# Altium integrated library CbyP.IntLib: 1144 symbols (part 1 of 6) (continued)
## KH-2.54FH-1X12P-H8.5 (continued)
CONN SOCKET 12POS 2.54mm SINGLE ROW TH; Manufacturer: kinghelm; Mfr.Part #: KH-2.54FH-1X12P-H8.5; LCSC Part #: C2905419; Package: Through Hole,P=2.54mm
footprint Plugin,P=2.54mm,12p,Female Headers
pins: 1, 2, 3, 4, 5, 6, 7, 8, 9, 10, 11, 12

## PH2.0 2P THANG
designator CN?, comment PH2.0-2P
1x2P 2P PH Tin 2 -25℃~+85℃ 2A 1 2mm Brass Direct Insert Plugin,P=2mm Wire To Board Connector ROHS; Manufacturer: JST; Mfr.Part #: B2B-PH-K-S(LF)(SN); Name: PH2.0 2P THANG; So_Chan_Cam: 2; So_Chan_Dan: 0; Package: Plugin,P=2mm
footprint Plugin,P=2mm,2P
pins: 1, 2

## PH2.0 3P THANG
designator CN?, comment PH2.0-3P
1x3P 3P PH Tin 3 -25℃~+85℃ 2A 1 2mm Brass Direct Insert Plugin,P=2mm Wire To Board Connector ROHS; Manufacturer: JST; Mfr.Part #: B3B-PH-K-S(LF)(SN); Name: PH2.0 3P THANG; So_Chan_Cam: 3; So_Chan_Dan: 0; Package: Plugin,P=2mm
footprint Plugin,P=2mm,3P
pins: 1, 2, 3

## PH2.0 4P CONG
designator CN?, comment PH2.0-4P
1x4P 4P PH 1 Tin 2mm 2mm 4 -25℃~+85℃ Brass 1A Bend insert Push-Pull,P=2mm Wire To Board Connector ROHS; Manufacturer: SHOU HAN; Mfr.Part #: 2.0MM-4P WZ; Name: PH2.0 4P THANG; So_Chan_Cam: 4; So_Chan_Dan: 0; Package: Push-Pull,P=2mm
footprint Push-Pull,P=2mm,4P-1
footprint Push-Pull,P=2mm,4P-2
pins: 1, 2, 3, 4

## PH2.0 5P CONG
designator CN?, comment PH2.0-5P
1x5P 5P PH 1 Tin 2mm 2mm 5 -25℃~+85℃ Brass 1A Bend insert Push-Pull,P=2mm Wire To Board Connector ROHS; Manufacturer: SHOU HAN; Mfr.Part #: 2.0MM-5P WZ; Name: PH2.0 2P THANG; So_Chan_Cam: 5; So_Chan_Dan: 0; Package: Push-Pull,P=2mm
footprint Push-Pull,P=2mm,5P-1
footprint Push-Pull,P=2mm,5P-2
pins: 1, 2, 3, 4, 5

## PH2.0 5P THANG
designator CN?, comment PH2.0-5P
1x5P 5P PH Tin 5 -25℃~+85℃ 2A 1 2mm Brass Straight Plugin,P=2mm Wire To Board Connector ROHS; Manufacturer: JST; Mfr.Part #: B5B-PH-K-S(LF)(SN); Name: PH2.0 2P THANG; So_Chan_Cam: 5; So_Chan_Dan: 0; Package: Plugin,P=2mm
footprint Plugin,P=2mm,5P
pins: 1, 2, 3, 4, 5

## PH2.0 8P THANG
designator CN?, comment PH2.0-8P
1x8P 8P PH Tin 8 -25℃~+85℃ 2A 1 2mm Brass Straight Plugin,P=2mm Wire To Board Connector ROHS; Manufacturer: JST; Mfr.Part #: B8B-PH-K-S(LF)(SN); Name: PH2.0 2P THANG; So_Chan_Cam: 8; So_Chan_Dan: 0; Package: Plugin,P=2mm
footprint Plugin,P=2mm,8P
pins: 1, 2, 3, 4, 5, 6, 7, 8

## PH2.0 9P THANG
designator CN?, comment PH2.0-9P
1x9P 9P PH Tin 9 -25℃~+85℃ 2A 1 2mm Brass Direct Insert Plugin,P=2mm Wire To Board Connector ROHS; Manufacturer: JST; Mfr.Part #: B9B-PH-K-S(LF)(SN); Name: PH2.0 9P THANG; So_Chan_Cam: 9; So_Chan_Dan: 0; Package: Plugin,P=2mm
footprint Plugin,P=2mm,9P
pins: 1, 2, 3, 4, 5, 6, 7, 8, 9

## PH2.0 10P CONG
designator CN?, comment PH2.0-10P
1x10P 10P 1 2mm 10 -25℃~+85℃ 1A Bend insert Push-Pull,P=2mm Wire To Board Connector ROHS; Manufacturer: SHOU HAN; Mfr.Part #: 2.0mm-10P WZ; Name: PH2.0 10P CONG; So_Chan_Cam: 10; So_Chan_Dan: 0; Package: Push-Pull,P=2mm
footprint Push-Pull,P=2mm,10P-2
pins: 1, 2, 3, 4, 5, 6, 7, 8, 9, 10

## PH2.0 12P THANG
designator CN?, comment PH2.0-12P
1x12P 12P PH Tin 12 -25℃~+85℃ 2A 1 2mm Brass Direct Insert Plugin,P=2mm Wire To Board Connector ROHS; Manufacturer: JST; Mfr.Part #: B12B-PH-K-S(LF)(SN); Name: PH2.0 12P THANG; So_Chan_Cam: 12; So_Chan_Dan: 0; Package: Plugin,P=2mm
footprint Plugin,P=2mm,12P
pins: 1, 2, 3, 4, 5, 6, 7, 8, 9, 10, 11, 12

## PH2.54 1x6P THANG
designator CN?, comment PH2.54 6P
3A Direct Insert Policy 6P -40℃~+105℃ 2.54mm Single Row Black Brass 1x6P Plugin,P=2.54mm Pin Headers ROHS; Manufacturer: BOOMELE(Boom Precision Elec); Mfr.Part #: 2.54-1x6P; Name: PH2.54 1x6P THANG; So_Chan_Cam: 6; So_Chan_Dan: 0; Package: Plugin,P=2.54mm
footprint Plugin,P=2.54mm,6P,Pin Headers
footprint Plugin,P=2.54mm,6P-1
pins: 1, 2, 3, 4, 5, 6

## PH2.54 1x8P THANG
designator CN?, comment PH2.54 8P
Gold 3A Direct Insert Policy 2.5mm 8P 6mm -40℃~+105℃ 3mm 2.54mm Black Brass Single Row 1x8P Plugin,P=2.54mm Pin Headers ROHS; Manufacturer: hanxia; Mfr.Part #: HX PZ2.54-1x8P ZZ; Name: PH2.54 1x8P THANG; So_Chan_Cam: 8; So_Chan_Dan: 0; Package: Plugin,P=2.54mm
footprint Plugin,P=2.54mm,8P,Pin Headers
footprint Plugin,P=2.54mm,8P-1
pins: 1, 2, 3, 4, 5, 6, 7, 8

## PH2.54 1x20P THANG
designator CN?, comment PH2.54 20P
3A Straight Policy 20P -40℃~+105℃ 2.54mm Single Row Black Brass 1x20P Plugin,P=2.54mm Pin Headers ROHS; Manufacturer: BOOMELE(Boom Precision Elec); Mfr.Part #: 2.54-1*20P; Name: PH2.54 1x20P THANG; So_Chan_Cam: 20; So_Chan_Dan: 0; Package: Plugin,P=2.54mm
footprint Plugin,P=2.54mm,20P,Pin Headers
footprint Plugin,P=2.54mm,20P,Pin Headers-1
pins: 1, 2, 3, 4, 5, 6, 7, 8, 9, 10, 11, 12, 13, 14, 15, 16, 17, 18, 19, 20

## PH2.54 2x2P THANG
designator CN?, comment PH2.54 2x2P
3A Direct Insert Policy 2.5mm 4P 6mm -40℃~+105℃ 3mm 2.54mm Double Row Black Brass 2x2P 2.54mm Plugin,P=2.54mm Pin Headers ROHS; Manufacturer: HCTL; Mfr.Part #: PZ254-2-02-Z-8.5; Name: PH2.54 2x2P THANG; So_Chan_Cam: 4; So_Chan_Dan: 0; Package: Plugin,P=2.54mm
footprint Plugin,P=2.54mm,2X2P,Pin Headers
pins: 1, 2, 3, 4

## PH2.54 2x4P THANG
designator CN?, comment PH2.54 2x4P
3A Direct Insert Policy 2.5mm 8P 6mm -40℃~+105℃ 3mm 2.54mm Double Row Black Brass 2.54mm 2x4P Plugin,P=2.54mm Pin Headers ROHS; Manufacturer: HCTL; Mfr.Part #: PZ254-2-04-Z-8.5; Name: PH2.54 2x4P THANG; So_Chan_Cam: 8; So_Chan_Dan: 0; Package: Plugin,P=2.54mm
footprint Plugin,P=2.54mm,2X4P,Pin Headers
pins: 1, 2, 3, 4, 5, 6, 7, 8

## PH2.54 2x5P THANG
designator CN?, comment PH2.54 2x5P
3A Direct Insert Policy 2.5mm 10P 6mm -40℃~+105℃ 3mm 2.54mm Double Row Black Brass 2x5P 2.54mm Plugin,P=2.54mm Pin; Manufacturer: HCTL; Mfr.Part #: PZ254-2-05-Z-8.5; Name: PH2.54 2x5P THANG; So_Chan_Cam: 10; So_Chan_Dan: 0; Package: Plugin,P=2.54mm
footprint Plugin,P=2.54mm,2X5P,Pin Headers
pins: 1, 2, 3, 4, 5, 6, 7, 8, 9, 10

## PH2.54 2x9P THANG
designator CN?, comment PH2.54 2x9P
3A Direct Insert Policy 2.5mm 260℃@10S 36P 6mm -40℃~+105℃ 3mm 2.54mm Double Row Black Brass 2x18P 2.54mm Plugin,P=2.54mm Pin Headers ROHS; Manufacturer: HCTL; Mfr.Part #: PZ254-2-18-Z-8.5; Name: PH2.54 2x9P THANG; So_Chan_Cam: 18; So_Chan_Dan: 0; Package: Plugin,P=2.54mm
footprint Plugin,P=2.54mm,2X9P,Pin Headers
pins: 1, 2, 3, 4, 5, 6, 7, 8, 9, 10, 11, 12, 13, 14, 15, 16, 17, 18

## PH2.54 2x15P THANG
designator CN?, comment FH2.54 2x15P
2.54mm 2.54mm Double Row 3A Copper alloy 30P -40℃~+105℃ Direct Insert 2x15P 8.5mm Top Square Hole Plugin,P=2.54mm Female Headers ROHS; Manufacturer: HCTL; Mfr.Part #: PM254-2-15-Z-8.5; Name: FH2.54 2x15P THANG; So_Chan_Cam: 30; So_Chan_Dan: 0; Package: Plugin,P=2.54mm
footprint Plugin,P=2.54mm,2x15P,Pin Headers
pins: 1, 2, 3, 4, 5, 6, 7, 8, 9, 10, 11, 12, 13, 14, 15, 16, 17, 18, 19, 20, 21, 22, 23, 24, 25, 26, 27, 28, 29, 30

## PH2.54-1X2P-H25
designator CN?, comment PH2.54-2P
Pin Header 2 Position 2.54mm Pitch Single Row Through Hole -40℃~+105℃; Manufacturer: JXTCONN; Mfr.Part #: PH2.54-1X2P-H25; LCSC Part #: C42431798; Package: Through Hole,P=2.54mm; DigiKey Part Number: NO; ComponentLink1Description: Link; ComponentLink1URL: https://www.lcsc.com/product-detail/C42431798.html?s_z=n_2.54-1%2a2P
footprint Plugin,P=2.54mm,2P,Pin Headers
pins: 1, 2

## PH2.54-1X4P-H25
designator CN?, comment PH2.54-4P
Pin Header 4 Position 2.54mm Pitch Single Row Through Hole -40℃~+105℃; Manufacturer: JXTCONN; Mfr.Part #: PH2.54-1X4P-H25; DigiKey Part Number: NO; Package: Plugin,P=2.54mm; LCSC Part #: C42431808
footprint Plugin,P=2.54mm,4P,Pin Headers
pins: 1, 2, 3, 4

## PH2.54-06PB2G-H25
designator CN?, comment PH2.54-6P
Gold 3A Through Hole Pin Header 2.5mm 6P 6mm -40℃~+105℃ 3mm 2.54mm Brass Black 1 1x6P Through Hole,P=2.54mm Pin Headers ROHS; Manufacturer: JXTCONN; Mfr.Part #: PH2.54-06PB2G-H25; LCSC Part #: C42431807; Package: Through Hole,P=2.54mm
footprint Plugin,P=2.54mm,6P,Pin Headers
pins: 1, 2, 3, 4, 5, 6

## Plugin,P=5.08mm,2P
designator CN?, comment 282837-2
13.5A 300V Green 16~28 Straight 5.08mm 1 3 Plugin,P=5.08mm Screw terminal ROHS; MF: TE Connectivity; SnapEDA_Link: https://www.snapeda.com/parts/282837-2/TE+Connectivity+AMP+Connectors/view-part/?ref=snap; Price: None; Check_prices: https://www.snapeda.com/parts/282837-2/TE+Connectivity+AMP+Connectors/view-part/?ref=eda; Purchase-URL: https://pricing.snapeda.com/search/part/282837-2/?ref=eda; MP: 282837-2; Value: *; Availability: In Stock; Package: None
footprint Plugin,P=5.08mm,2P
pins: 1, 2

## PM2.54-1*10
designator CN?, comment FH2.54-10P
Female Header 10 Position 2.54mm Pitch Single Row Through Hole -40℃~+105℃; Manufacturer: ZHOURI; Mfr.Part #: PM2.54-1*10; LCSC Part #: C5116489; Package: Through Hole,P=2.54mm
footprint Plugin,P=2.54mm,10P,FEMALE HEADERS
pins: 1, 2, 3, 4, 5, 6, 7, 8, 9, 10

## PM254-2-05-Z-8.5
designator CN?, comment FH2.54-2x5P
Female Header 10 Position 2.54mm Pitch Dual Row Through Hole -40℃~+105℃; Manufacturer: HCTL; Mfr.Part #: PM254-2-05-Z-8.5; LCSC Part #: C2897406; Package: Through Hole,P=2.54mm
footprint Through Hole,P=2.54mm,2x5P,Female Headers
pins: 1, 2, 3, 4, 5, 6, 7, 8, 9, 10

## PZ254-2-03-Z-8.5
designator CN?, comment PH2.54-2x3P
6P 2x3P Brass -40℃~+105℃ Black Pin Header 2.54mm 2.5mm 6mm 3mm 2 3A Through Hole 2.54mm Through Hole,P=2.54mm Headers, Male Pins RoHS; Manufacturer: HCTL; Mfr.Part #: PZ254-2-03-Z-8.5; LCSC Part #: PH2.54 2x3P THANG; Package: Through Hole,P=2.54mm; DigiKey Part Number: NO
footprint Plugin,P=2.54mm,2X3P,Pin Headers
pins: 1, 2, 3, 4, 5, 6

## PZ254V-11-07P
designator CN?, comment PH2.54-7P
Pin Header 7 Position 2.54mm Pitch Single Row Through Hole -40℃~+105℃; Manufacturer: XFCN; Mfr.Part #: PZ254V-11-07P; LCSC Part #: C492406; Package: Through Hole,P=2.54mm
footprint Through Hole,P=2.54mm,7P,Pin Headers
pins: 1, 2, 3, 4, 5, 6, 7

## PZ254V-11-08P
designator CN?, comment PH2.54-8P
CONN HEADER 8POS 2.54mm SINGLE ROW TH; Manufacturer: XFCN; Mfr.Part #: PZ254V-11-08P; LCSC Part #: C492407; Package: Through Hole,P=2.54mm
footprint Through Hole,P=2.54mm,8P,Pin Headers
pins: 1, 2, 3, 4, 5, 6, 7, 8

## PZ254V-11-12P
designator CN?, comment PH2.54-12P
CONN HEADER 12POS 2.54mm SINGLE ROW TH; Manufacturer: XFCN; Mfr.Part #: PZ254V-11-12P; LCSC Part #: C2840012; Package: Through Hole,P=2.54mm
footprint Plugin,P=2.54mm,12P,Pin Headers
pins: 1, 2, 3, 4, 5, 6, 7, 8, 9, 10, 11, 12

## PZ254V-12-16P
designator CN?, comment PH2.54-2x8P
Pin Header 16 Position 2.54mm Pitch Dual Row Through Hole -40℃~+105℃; Manufacturer: XFCN; Mfr.Part #: PZ254V-12-16P; LCSC Part #: C492425; Package: Through Hole,P=2.54mm; DigiKey Part Number: NO
footprint Plugin,P=2.54mm,2X8P,Pin Headers
pins: 1, 2, 3, 4, 5, 6, 7, 8, 9, 10, 11, 12, 13, 14, 15, 16

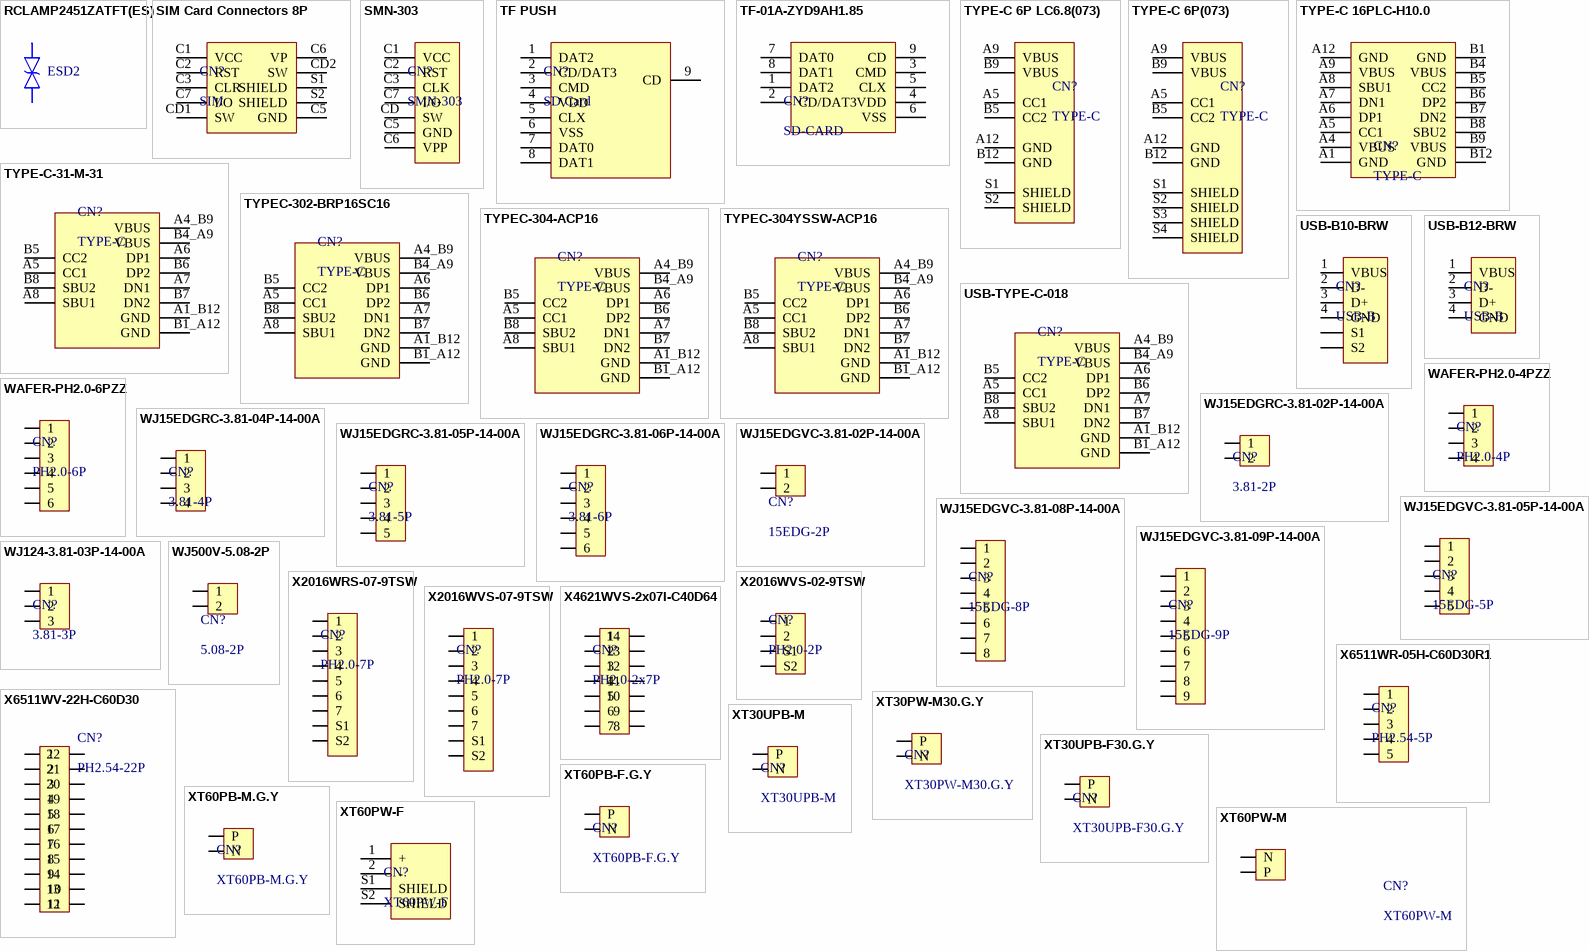
[diagram p3: symbols RCLAMP2451ZATFT(ES) to XT60PW-M]

## RCLAMP2451ZATFT(ES)
designator ESD2  (value not drawn)
ESD DIODE 24VWM 5.6VC DFN0603-2L; Manufacturer: ElecSuper; Mfr.Part #: RCLAMP2451ZATFT(ES); Package: DFN0603-2L; LCSC Part #: C42400636
footprint DFN0603-2L
pins: 1 A, 2 K

## SIM Card Connectors 8P
designator CN?, comment SIM
Self-bouncing 1.8mm Card Slot -40℃~+85℃ MiniSIM card SMD SIM Card Connectors ROHS; Manufacturer: MOLEX; Mfr.Part #: 475531001; Name: SIM Card Connectors 8P; So_Chan_Cam: 0; So_Chan_Dan: 10; Package: SMD
footprint SMD-SIM
pins: C1 VCC, C2 RST, C3 CLR, C5 GND, C6 VP, C7 I/O, CD1 SW, CD2 SW, S1 SHIELD, S2 SHIELD

## SMN-303
designator CN?
Card Connector NANO SIM Push-Push Surface Mount; Manufacturer: XUNPU; Mfr.Part #: SMN-303; LCSC Part #: C266888; Package: SMD; DigiKey Part Number: NO; ComponentLink1Description: Link; ComponentLink1URL: https://www.lcsc.com/product-detail/C266888.html?s_z=n_SMN303; ComponentLink2Description: Link 1
footprint SIM_NANO_CARD_SMD
pins: C1 VCC, C2 RST, C3 CLK, C5 GND, C6 VPP, C7 I/O, CD SW

## TF PUSH
designator CN?, comment SD Card
-25℃~+90℃ Push-Push 2mm Connector and Ejector MicroSD Card (TF Card) SMD PC Card Sockets ROHS; Manufacturer: SHOU HAN; Mfr.Part #: TF PUSH; LCSC Part #: C393941; Package: SMD; DigiKey Part Number: NO
footprint SMD-SD CARD
pins: 1 DAT2, 2 CD/DAT3, 3 CMD, 4 VDD, 5 CLX, 6 VSS, 7 DAT0, 8 DAT1, 9 CD

## TF-01A-ZYD9AH1.85
designator CN?, comment SD-CARD
Micro SD card (TF card) Surface Mount; Manufacturer: XYECONN; Mfr.Part #: TF-01A-ZYD9AH1.85; LCSC Part #: C20613191; Package: SMD; DigiKey Part Number: NO
footprint SMD-SD CARD
pins: 1 DAT2, 2 CD/DAT3, 3 CMD, 4 VDD, 5 CLX, 6 VSS, 7 DAT0, 8 DAT1, 9 CD

## TYPE-C 6P LC6.8(073)
designator CN?, comment TYPE-C
CONN RCPT Type-C 6POS TH; Mfr.Part #: TYPE-C 6P LC6.8(073); Manufacturer: SHOU HAN; Package: Through Hole; LCSC Part #: C2858272
footprint TYPE-C-6P-1
pins: A5 CC1, A9 VBUS (power), A12 GND (power), B5 CC2, B9 VBUS (power), B12 GND (power), S1 SHIELD, S2 SHIELD

## TYPE-C 6P(073)
designator CN?, comment TYPE-C
CONN RCPT USB 3.1 Type-C 6POS SMD R/A; Mfr.Part #: TYPE-C 6P(073); Manufacturer: SHOU HAN; Package: SMD; LCSC Part #: C668623
footprint TYPE-C-6P-SMD
pins: A5 CC1, A9 VBUS (power), A12 GND (power), B5 CC2, B9 VBUS (power), B12 GND (power), S1 SHIELD, S2 SHIELD, S3 SHIELD, S4 SHIELD

## TYPE-C 16PLC-H10.0
designator CN?, comment TYPE-C
USB-C (USB TYPE-C) Receptacle Connector 16 Position Through Hole; Manufacturer: SHOU HAN; Mfr.Part #: TYPE-C 16PLC-H10.0; LCSC Part #: C3151747; Package: Through Hole; DigiKey Part Number: NO; ComponentLink1Description: Link; ComponentLink1URL: https://www.lcsc.com/product-detail/C3151747.html?s_z=n_TYPE-C
footprint TYPE-C-16P-4
pins: A1 GND (power), A4 VBUS (power), A5 CC1, A6 DP1, A7 DN1, A8 SBU1, A9 VBUS (power), A12 GND (power), B1 GND (power), B4 VBUS (power), B5 CC2, B6 DP2, B7 DN2, B8 SBU2, B9 VBUS (power), B12 GND (power)

## TYPE-C-31-M-31
designator CN?, comment TYPE-C
USB-C (USB TYPE-C) Receptacle Connector 16 Position Surface Mount, Right Angle; Manufacturer: Korean Hroparts Elec; Mfr.Part #: TYPE-C-31-M-31; LCSC Part #: C2760486; Package: SMD; DigiKey Part Number: NO
footprint TYPE-C-16P-2
pins: A1_B12 GND (power), A4_B9 VBUS (power), A5 CC1, A6 DP1, A7 DN1, A8 SBU1, B1_A12 GND (power), B4_A9 VBUS (power), B5 CC2, B6 DP2, B7 DN2, B8 SBU2

## TYPEC-302-BRP16SC16
designator CN?, comment TYPE-C
5A USB 3.1 1 260℃ Sink board 16P Female -45℃~+85℃ Type-C SMD USB Connectors ROHS; Manufacturer: XUNPU; Mfr.Part #: TYPEC-302-BRP16SC16; DigiKey Part Number: NO; LCSC Part #: C2835313; Package: SMD
footprint TYPE-C-16P-1
pins: A1_B12 GND (power), A4_B9 VBUS (power), A5 CC1, A6 DP1, A7 DN1, A8 SBU1, B1_A12 GND (power), B4_A9 VBUS (power), B5 CC2, B6 DP2, B7 DN2, B8 SBU2

## TYPEC-304-ACP16
designator CN?, comment TYPE-C
3A 1 Horizontal attachment 16P Female -40℃~+85℃ Type-C SMD USB Connectors ROHS; Manufacturer: XUNPU; Mfr.Part #: TYPEC-304-ACP16; So_Chan_Dan: 20; So_Chan_Cam: 0; Name: TYPEC-304-ACP16; Package: SMD
footprint TYPE-C-16P-2
pins: A1_B12 GND (power), A4_B9 VBUS (power), A5 CC1, A6 DP1, A7 DN1, A8 SBU1, B1_A12 GND (power), B4_A9 VBUS (power), B5 CC2, B6 DP2, B7 DN2, B8 SBU2

## TYPEC-304YSSW-ACP16
designator CN?, comment TYPE-C
1 16P -25℃~+85℃ Type-C SMD USB, DVI, HDMI Connector Assemblies RoHS; Manufacturer: XUNPU; Mfr.Part #: TYPEC-304YSSW-ACP16; LCSC Part #: C2840392; DigiKey Part Number: NO; Package: SMD
footprint TYPE-C-16P-3
pins: A1_B12 GND (power), A4_B9 VBUS (power), A5 CC1, A6 DP1, A7 DN1, A8 SBU1, B1_A12 GND (power), B4_A9 VBUS (power), B5 CC2, B6 DP2, B7 DN2, B8 SBU2

## USB-B10-BRW
designator CN?, comment USB-B
CONN RCPT USB 2.0 Type-B 4POS TH R/A; Manufacturer: XUNPU; Mfr.Part #: USB-B10-BRW; LCSC Part #: C720549; Package: Through Hole
footprint Through Hole,Right Angle, USB-B
pins: 1 VBUS, 2 D-, 3 D+, 4 GND, S1, S2

## USB-B12-BRW
designator CN?, comment USB-B
USB-B (USB TYPE-B) Receptacle Connector 4 Position Through Hole; Manufacturer: XUNPU; Mfr.Part #: USB-B12-BRW; LCSC Part #: C720550; Package: Through Hole; DigiKey Part Number: NO
footprint Through Hole, USB-B
pins: 1 VBUS, 2 D-, 3 D+, 4 GND

## USB-TYPE-C-018
designator CN?, comment TYPE-C
1 16P -25℃~+85℃ Type-C SMD USB, DVI, HDMI Connector Assemblies RoHS; Manufacturer: DEALON; Mfr.Part #: USB-TYPE-C-018; LCSC Part #: C2927038; Package: SMD; DigiKey Part Number: NO
footprint TYPE-C-16P-2
pins: A1_B12 GND (power), A4_B9 VBUS (power), A5 CC1, A6 DP1, A7 DN1, A8 SBU1, B1_A12 GND (power), B4_A9 VBUS (power), B5 CC2, B6 DP2, B7 DN2, B8 SBU2

## WAFER-PH2.0-4PZZ
designator CN?, comment PH2.0-4P
CONN HEADER TH 4POS 2mm; Manufacturer: XUNPU; Mfr.Part #: WAFER-PH2.0-4PZZ; LCSC Part #: C5359601; Package: Through Hole,P=2mm
footprint Through Hole,P=2mm,4P
pins: 1, 2, 3, 4

## WAFER-PH2.0-6PZZ
designator CN?, comment PH2.0-6P
CONN HEADER TH 6POS 2mm; Manufacturer: XUNPU; Mfr.Part #: WAFER-PH2.0-6PZZ; LCSC Part #: C5359603; Package: Through Hole,P=2mm
footprint Through Hole,P=2.5mm,6P
pins: 1, 2, 3, 4, 5, 6

## WJ15EDGRC-3.81-02P-14-00A
designator CN?, comment 3.81-2P
TERM BLOCK HDR 2POS 3.81mm; Manufacturer: KANGNEX; Mfr.Part #: WJ15EDGRC-3.81-02P-14-00A; Package: Through Hole,Right Angle,P=3.81mm; LCSC Part #: C8387
footprint Through Hole,Right Angle,P=3.81mm,2P
pins: 1, 2

## WJ15EDGRC-3.81-04P-14-00A
designator CN?, comment 3.81-4P
TERM BLOCK HDR 4POS 3.81mm; Manufacturer: KANGNEX; Mfr.Part #: WJ124-3.81-03P-14-00A; Package: Through Hole,Right Angle,P=3.81mm; LCSC Part #: C7245
footprint Through Hole,Right Angle,P=3.81mm,4P
pins: 1, 2, 3, 4

## WJ15EDGRC-3.81-05P-14-00A
designator CN?, comment 3.81-5P
TERM BLOCK HDR 5POS 3.81mm; Manufacturer: KANGNEX; Mfr.Part #: WJ15EDGRC-3.81-05P-14-00A; Package: Through Hole,Right Angle,P=3.81mm; LCSC Part #: C8395
footprint Through Hole,Right Angle,P=3.81mm,5P
pins: 1, 2, 3, 4, 5

## WJ15EDGRC-3.81-06P-14-00A
designator CN?, comment 3.81-6P
TERM BLOCK HDR 6POS 3.81mm; Manufacturer: KANGNEX; Mfr.Part #: WJ15EDGRC-3.81-06P-14-00A; Package: Through Hole,Right Angle,P=3.81mm; LCSC Part #: C7246
footprint Through Hole,Right Angle,P=3.81mm,6P
pins: 1, 2, 3, 4, 5, 6

## WJ15EDGVC-3.81-02P-14-00A
designator CN?, comment 15EDG-2P
2 Position Board Side/Socket - Closed 3.81mm Pitch Straight Pin; Manufacturer: KANGNEX; Mfr.Part #: WJ15EDGVC-3.81-02P-14-00A; LCSC Part #: C8396; Package: Through Hole,P=3.81mm; DigiKey Part Number: NO
footprint Plugin,P=3.81,2P
pins: 1, 2

## WJ15EDGVC-3.81-05P-14-00A
designator CN?, comment 15EDG-5P
5 Position Board Side/Socket - Closed 3.81mm Pitch Straight Pin; Manufacturer: KANGNEX; Mfr.Part #: WJ15EDGVC-3.81-05P-14-00A; LCSC Part #: C8391; Package: Through Hole,P=3.81mm; DigiKey Part Number: NO
footprint Plugin,P=3.81,5P
pins: 1, 2, 3, 4, 5

## WJ15EDGVC-3.81-08P-14-00A
designator CN?, comment 15EDG-8P
8 Position Board Side/Socket - Closed 3.81mm Pitch Straight Pin; Manufacturer: KANGNEX; Mfr.Part #: WJ15EDGVC-3.81-08P-14-00A; LCSC Part #: C31930; Package: Through Hole,P=3.81mm; DigiKey Part Number: NO
footprint Plugin,P=3.81,8P
pins: 1, 2, 3, 4, 5, 6, 7, 8

## WJ15EDGVC-3.81-09P-14-00A
designator CN?, comment 15EDG-9P
9 Position Board Side/Socket - Closed 3.81mm Pitch Straight Pin; Manufacturer: KANGNEX; Mfr.Part #: WJ15EDGVC-3.81-09P-14-00A; LCSC Part #: C49737; Package: Through Hole,P=3.81mm; DigiKey Part Number: NO
footprint Plugin,P=3.81,9P
pins: 1, 2, 3, 4, 5, 6, 7, 8, 9

## WJ124-3.81-03P-14-00A
designator CN?, comment 3.81-3P
3 Position Wire to Board Terminal Block Through Hole 3.81mm; Manufacturer: KANGNEX; Mfr.Part #: WJ124-3.81-03P-14-00A; DigiKey Part Number: NO; Package: Through Hole,P=3.81mm; LCSC Part #: C36780
footprint Through Hole,P=3.81mm,3P
pins: 1, 2, 3

## WJ500V-5.08-2P
designator CN?, comment 5.08-2P
TERM BLK 2POS 5.08mm TH; Manufacturer: KANGNEX; Mfr.Part #: WJ500V-5.08-2P; LCSC Part #: C8465; Package: Through Hole,P=5.08mm
footprint Through Hole,P=5.08mm,2P
pins: 1, 2

## X2016WRS-07-9TSW
designator CN?, comment PH2.0-7P
CONN HEADER SMD R/A 7POS 2mm; Manufacturer: XKB Connection; Mfr.Part #: X2016WRS-07-9TSW; LCSC Part #: C519173; Package: SMD,P=2mm,Surface Mount,Right Angle
footprint SMD,P=2mm,Surface Mount,Right Angle,7P
pins: 1, 2, 3, 4, 5, 6, 7, S1 S2, S2 S1

## X2016WVS-02-9TSW
designator CN?, comment PH2.0-2P
CONN HEADER SMD 2POS 2mm; Manufacturer: XKB Connection; Mfr.Part #: X2016WVS-02-9TSW; Package: SMD,P=2mm; LCSC Part #: C519159
footprint SMD,P=2mm,2P
pins: 1, 2, S1, S2

## X2016WVS-07-9TSW
designator CN?, comment PH2.0-7P
CONN HEADER SMD 7POS 2mm; Manufacturer: XKB Connection; Mfr.Part #: X2016WVS-07-9TSW; LCSC Part #: C519164; Package: SMD,P=2mm
footprint SMD,P=2mm,7P
pins: 1, 2, 3, 4, 5, 6, 7, S1 S2, S2 S1

## X4621WVS-2x07I-C40D64
designator CN?, comment PH2.0-2x7P
Pin Header 14 Position 2mm Pitch Dual Row -40℃~+105℃; Manufacturer: XKB Connection; Mfr.Part #: X4621WVS-2x07I-C40D64; LCSC Part #: C917612; Package: SMD,P=2mm; ComponentLink1Description: Link; ComponentLink1URL: https://www.lcsc.com/product-detail/C917612.html; ComponentLink2Description: Link 1; DigiKey Part Number: NO
footprint SMD,P=2mm,PIN HEADER,2x7P
pins: 1, 2, 3, 4, 5, 6, 7, 8, 9, 10, 11, 12, 13, 14

## X6511WR-05H-C60D30R1
designator CN?, comment PH2.54-5P
5P 1x5P Gold Brass -40℃~+105℃ Black Pin Header 2.54mm 2.5mm 250V 1 3A 2.54mm Through Hole,Right Angle,P=2.54mm Headers, Male Pins RoHS; Manufacturer: XKB Connection; Mfr.Part #: X6511WR-05H-C60D30R1; LCSC Part #: C2883843; Package: Through Hole,Right Angle,P=2.54mm
footprint Through Hole,Right Angle,P=2.54mm
pins: 1, 2, 3, 4, 5

## X6511WV-22H-C60D30
designator CN?, comment PH2.54-22P
22P 1x22P Gold Brass -40℃~+105℃ Black Pin Header 2.54mm 2.5mm 250V 1 3A 2.54mm Through Hole,P=2.54mm Headers, Male Pins RoHS; Manufacturer: XKB Connection; Mfr.Part #: X6511WV-22H-C60D30; LCSC Part #: C725954; Package: Through Hole,P=2.54mm; DigiKey Part Number: NO
footprint Plugin,P=2.54mm,22P,Pin Headers-1
pins: 1, 2, 3, 4, 5, 6, 7, 8, 9, 10, 11, 12, 13, 14, 15, 16, 17, 18, 19, 20, 21, 22

## XT30PW-M30.G.Y
designator CN?
Banana and Tip Connector Adapters RoHS; Manufacturer: Changzhou Amass Elec; Mfr.Part #: XT30PW-M30.G.Y; LCSC Part #: C431092; Package: Through Hole; DigiKey Part Number: NO; ComponentLink1Description: Link; ComponentLink1URL: https://www.lcsc.com/product-detail/C428721.html?s_z=n_xt30
footprint XT30PW-M
pins: 1 P, 2 N

## XT30UPB-F30.G.Y
designator CN?
Model aircraft plug 15A 500VDC Power Connectors RoHS; Manufacturer: Changzhou Amass Elec; Mfr.Part #: XT30UPB-F30.G.Y; LCSC Part #: C108769; Package: Through Hole; DigiKey Part Number: NO; ComponentLink1Description: Link; ComponentLink1URL: https://www.lcsc.com/product-detail/C108769.html?s_z=n_xt30; ComponentLink2Description: Link 1
footprint XT30UPB-F30.G.Y
pins: 1 P, 2 N

## XT30UPB-M
designator CN?
Model aircraft plug 15A 500VDC Power Connectors RoHS; Manufacturer: Changzhou Amass Elec; Mfr.Part #: XT30PW-M30.G.Y; LCSC Part #: C428721; Package: Through Hole; DigiKey Part Number: NO; ComponentLink1Description: Link; ComponentLink1URL: https://www.lcsc.com/product-detail/C431092.html?s_z=n_xt30; ComponentLink2Description: Link 1
footprint XT30UPB-M
pins: 1 P, 2 N

## XT60PB-F.G.Y
designator CN?
Power Connectors RoHS; Manufacturer: Changzhou Amass Elec; Mfr.Part #: XT60PB-F.G.Y; LCSC Part #: C19268037; Package: Through Hole; DigiKey Part Number: NO; ComponentLink1Description: Link; ComponentLink1URL: https://www.lcsc.com/product-detail/C19268037.html?s_z=n_xt60; ComponentLink2Description: Link 1
footprint XT60PB-F.G.Y
pins: 1 P, 2 N

## XT60PB-M.G.Y
designator CN?
Power Connectors RoHS; Manufacturer: Changzhou Amass Elec; Mfr.Part #: XT60PB-M.G.Y; LCSC Part #: C19268037; Package: Through Hole; DigiKey Part Number: NO; ComponentLink1Description: Link; ComponentLink1URL: https://www.lcsc.com/product-detail/C19268037.html?s_z=n_xt60; ComponentLink2Description: Link 1
footprint XT60PB-M.G.Y
pins: 1 P, 2 N

## XT60PW-F
designator CN?
plug ROHS; Manufacturer: Changzhou Amass Elec; So_Chan_Cam: 4; So_Chan_Dan: 0; Mfr.Part #: XT60PW-F; Name: XT60PW-F; Package: XT60PW-F
footprint XT60PW-F
pins: 1 +, 2 -, S1 SHIELD, S2 SHIELD

## XT60PW-M
designator CN?
Banana and Tip Connector Adapters RoHS; Manufacturer: Changzhou Amass Elec; Mfr.Part #: XT60PW-M; LCSC Part #: C98732; Package: XT60PW-M; DigiKey Part Number: NO; ComponentLink1Description: Link; ComponentLink1URL: https://www.lcsc.com/product-detail/C98732.html?s_z=n_XT60
footprint XT60PW-M
pins: 1 P, 2 N

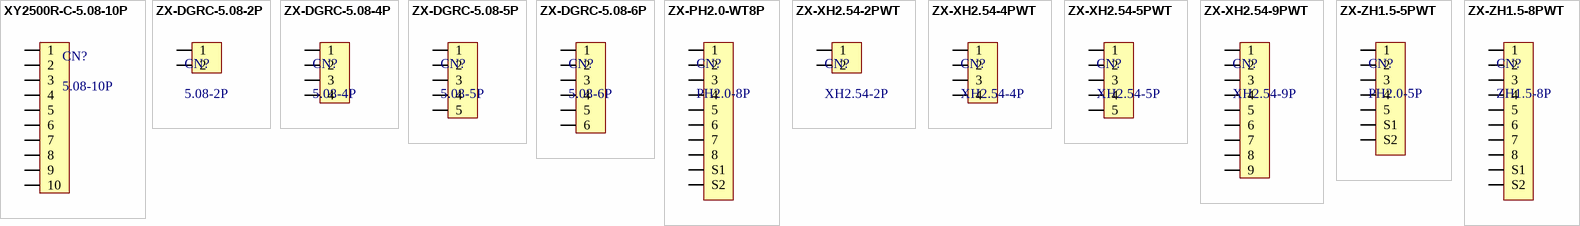
[diagram p4: symbols XY2500R-C-5.08-10P to ZX-ZH1.5-8PWT]

## XY2500R-C-5.08-10P
designator CN?, comment 5.08-10P
15A Green 300V 5.08mm Board Side/Socket - Open 1 10 1x10P Right-Angle Pin Through Hole,Right Angle,P=5.08mm Headers, Plugs and Sockets RoHS-Close Push-Pull,P=5.08mm Pluggable System Terminal Block ROHS; Manufacturer: XINLAIYA; Mfr.Part #: XY2500R-C-5.08-10P; Package: Through Hole,Right Angle,P=5.08mm; LCSC Part #: C505814; DigiKey Part Number: NO
footprint Through Hole,Right Angle,P=5.08mm,10P
pins: 1, 2, 3, 4, 5, 6, 7, 8, 9, 10

## ZX-DGRC-5.08-2P
designator CN?, comment 5.08-2P
TERM BLOCK HDR 2POS 5.08mm; Manufacturer: Megastar; Mfr.Part #: ZX-DGRC-5.08-2P; LCSC Part #: C42378069; Package: Through Hole,Right Angle,P=5.08mm
footprint Through Hole,Right Angle,P=5.08mm,2P
pins: 1, 2

## ZX-DGRC-5.08-4P
designator CN?, comment 5.08-4P
4 Position Board Side/Socket - Closed 5.08mm Pitch Right-Angle Pin; Manufacturer: Megastar; Mfr.Part #: ZX-DGRC-5.08-4P; LCSC Part #: C42378071; Package: Through Hole,Right Angle,P=5.08mm; DigiKey Part Number: NO
footprint Through Hole,Right Angle,P=5.08mm,4P
pins: 1, 2, 3, 4

## ZX-DGRC-5.08-5P
designator CN?, comment 5.08-5P
TERM BLOCK HDR 5POS 5.08mm; Manufacturer: Megastar; Mfr.Part #: ZX-DGRC-5.08-5P; LCSC Part #: C42378072; Package: Through Hole,Right Angle,P=5.08mm
footprint Through Hole,Right Angle,P=5.08mm,5P
pins: 1, 2, 3, 4, 5

## ZX-DGRC-5.08-6P
designator CN?, comment 5.08-6P
TERM BLOCK HDR 6POS 5.08mm; Manufacturer: Megastar; Mfr.Part #: ZX-DGRC-5.08-6P; LCSC Part #: C42378073; Package: Through Hole,Right Angle,P=5.08mm
footprint Through Hole,Right Angle,P=5.08mm,6P
pins: 1, 2, 3, 4, 5, 6

## ZX-PH2.0-WT8P
designator CN?, comment PH2.0-8P
CONN HEADER SMD R/A 8POS 2mm; Manufacturer: Megastar; Mfr.Part #: ZX-PH2.0-WT8P; LCSC Part #: C7429695; Package: SMD,P=2mm,Surface Mount,Right Angle
footprint SMD,P=2mm,Surface Mount,Right Angle,8P
pins: 1, 2, 3, 4, 5, 6, 7, 8, S1 S2, S2 S1

## ZX-XH2.54-2PWT
designator CN?, comment XH2.54-2P
Connector Header 2 position 2.5mm Pitch 3A Surface Mount, Right Angle -25℃~+85℃; Manufacturer: Megastar; Mfr.Part #: ZX-XH2.54-2PWT; LCSC Part #: C7429671; Package: SMD,P=2.5mm,Surface Mount,Right Angle; DigiKey Part Number: NO
footprint SMD,P=2.5,Right Angle,2P
pins: 1, 2

## ZX-XH2.54-4PWT
designator CN?, comment XH2.54-4P
Connector Header 4 position 2.5mm Pitch 3A Surface Mount, Right Angle -25℃~+85℃; Manufacturer: Megastar; Mfr.Part #: ZX-XH2.54-4PWT; LCSC Part #: C7429673; Package: SMD,P=2.5mm,Surface Mount,Right Angle; DigiKey Part Number: NO
footprint SMD,P=2.5,Right Angle,4P
pins: 1, 2, 3, 4

## ZX-XH2.54-5PWT
designator CN?, comment XH2.54-5P
Connector Header 5 position 2.5mm Pitch 3A Surface Mount, Right Angle -25℃~+85℃; Manufacturer: Megastar; Mfr.Part #: ZX-XH2.54-5PWT; LCSC Part #: C7429674; Package: SMD,P=2.5mm,Surface Mount,Right Angle; DigiKey Part Number: NO
footprint SMD,P=2.5,Right Angle,5P
pins: 1, 2, 3, 4, 5

## ZX-XH2.54-9PWT
designator CN?, comment XH2.54-9P
Connector Header 9 position 2.5mm Pitch 3A Surface Mount, Right Angle -25℃~+85℃; Manufacturer: Megastar; Mfr.Part #: ZX-XH2.54-9PWT; LCSC Part #: C7429678; Package: SMD,P=2.5mm,Surface Mount,Right Angle; DigiKey Part Number: NO
footprint SMD,P=2.5,Right Angle,9P
pins: 1, 2, 3, 4, 5, 6, 7, 8, 9

## ZX-ZH1.5-5PWT
designator CN?, comment PH2.0-5P
SMD,P=1.5mm,Surface Mount,Right Angle; Manufacturer: Megastar; Mfr.Part #: ZX-ZH1.5-5PWT; LCSC Part #: C19272408; Package: SMD,P=2mm,Surface Mount,Right Angle
footprint SMD,P=1.5mm,Surface Mount,Right Angle,5P
pins: 1, 2, 3, 4, 5, S1 S2, S2 S1

## ZX-ZH1.5-8PWT
designator CN?, comment ZH1.5-8P
CONN HEADER SMD R/A 8POS 1.5mm; Manufacturer: Megastar; Mfr.Part #: ZX-ZH1.5-8PWT; LCSC Part #: C19272411; Package: SMD,P=1.5mm,Surface Mount,Right Angle
footprint SMD,P=1.5mm,Surface Mount,Right Angle,8P
pins: 1, 2, 3, 4, 5, 6, 7, 8, S1 S2, S2 S1


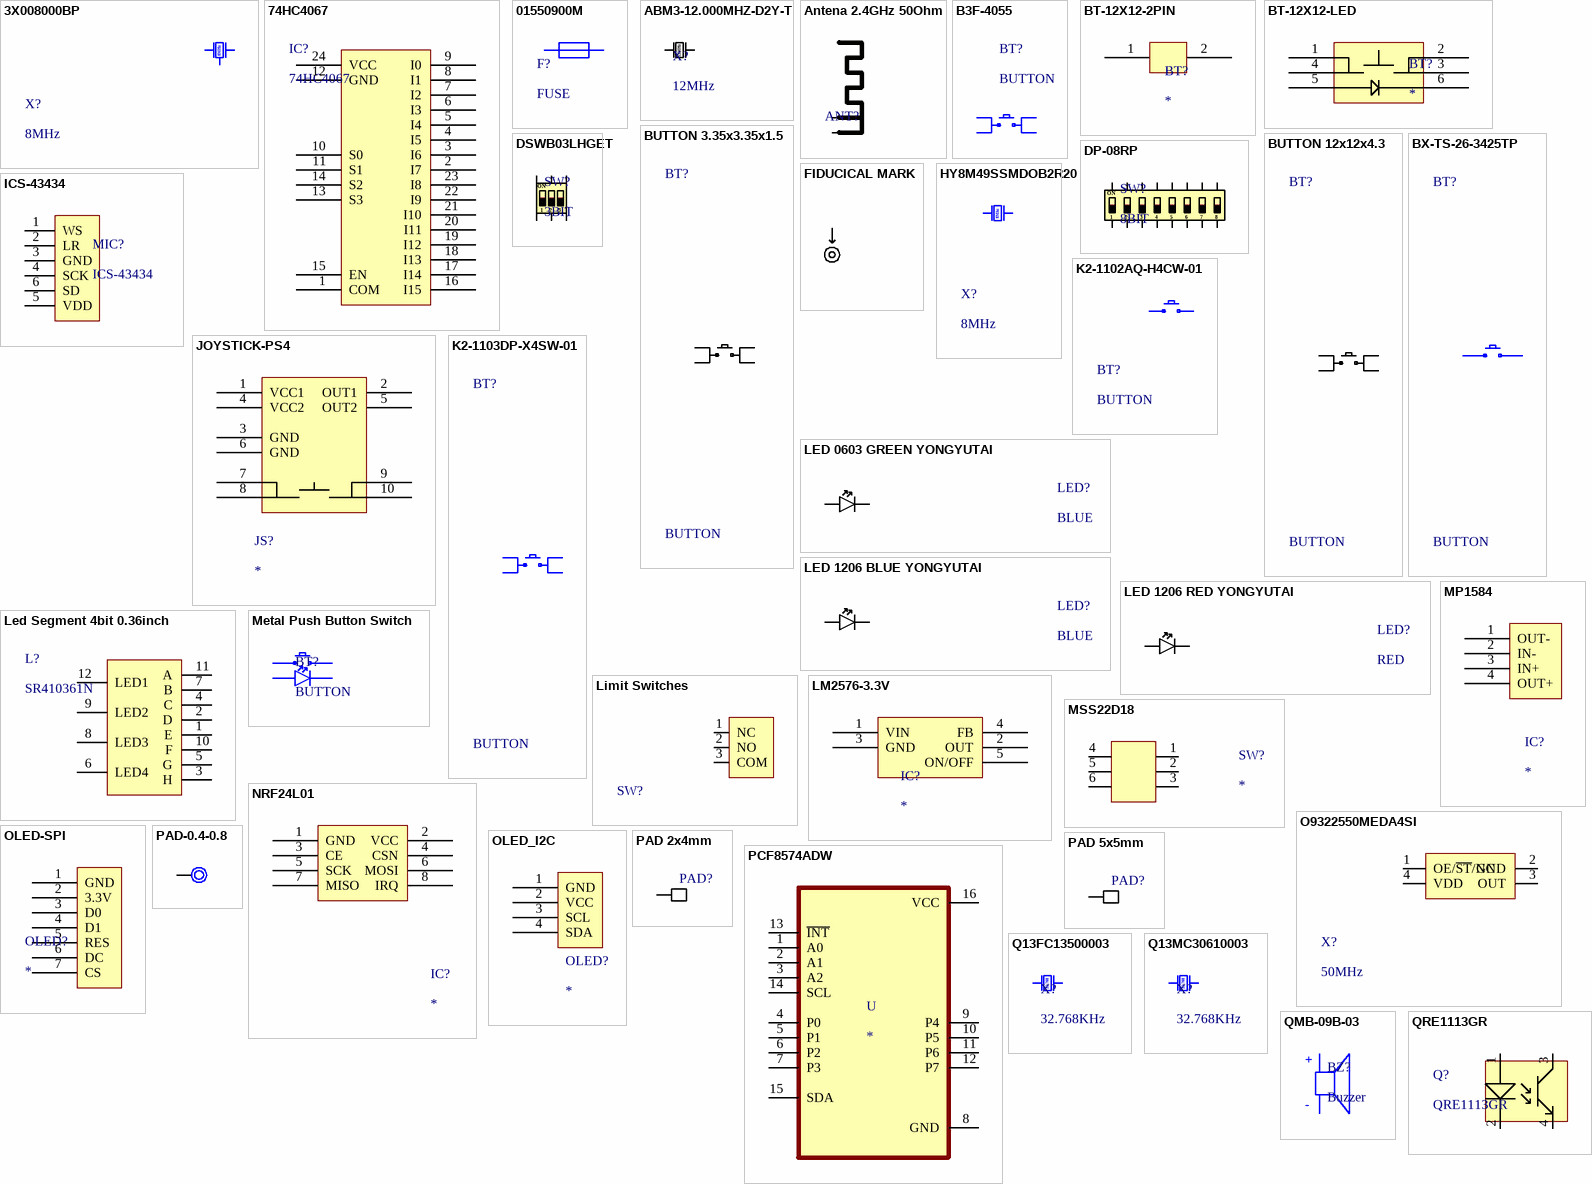
[diagram p5: symbols 3X008000BP to QRE1113GR]

## 3X008000BP
designator X?, comment 8MHz
Crystal 8MHz ±10ppm 12pF 60Ω SMD3225-4P; Manufacturer: huaxindianzi; Mfr.Part #: 3X008000BP; Package: SMD3225-4P; LCSC Part #: C19723344; DigiKey Part Number: NO
footprint SMD3225-4P
pins: 1, 2 GND, 3, 4 GND

## 74HC4067
designator IC?
SSOP-24-208mil Analog Switches / Multiplexers ROHS; Manufacturer: Nexperia; Mfr.Part #: 74HC4067DB,118; So_Chan_Dan: 24; So_Chan_Cam: 0; Package: SSOP-24-208mil; Name: 74HC4067
footprint SSOP-24-208mil
pins: 1 COM, 2 I7, 3 I6, 4 I5, 5 I4, 6 I3, 7 I2, 8 I1, 9 I0, 10 S0, 11 S1, 12 GND, 13 S3, 14 S2, 15 EN, 16 I15, 17 I14, 18 I13, 19 I12, 20 I11, 21 I10, 22 I9, 23 I8, 24 VCC

## 01550900M
designator F?, comment FUSE
Rectangular prism Bracket type 1 SMD,9.7x5mm Fuseholders RoHS; Manufacturer: Littelfuse; Mfr.Part #: 01550900M; Package: SMD,5.0x9.7mm; LCSC Part #: C108518; DigiKey Part Number: F1889-ND
footprint SMD,5.0x9.7mm
pins: 1, 2

## ABM3-12.000MHZ-D2Y-T
designator X?, comment 12MHz
SMD5032 Crystals ROHS; Manufacturer: Abracon LLC; Mfr.Part #: ABM3-12.000MHZ-D2Y-T; Package: SMD5032; LCSC Part #: C148313
footprint SMD3215
pins: 1, 2

## Antena 2.4GHz 50Ohm
designator ANT?  (value not drawn)
footprint ANTENNA 2.4GHz
pins: 1 GND, 2

## B3F-4055
designator BT?, comment BUTTON
Tactile Switch SPST 7.3mm 12mm x 12mm Through Hole; Manufacturer: OMRON; Mfr.Part #: B3F-4055; LCSC Part #: C84931; Package: Through Hole-4P,12x12mm; DigiKey Part Number: SW414-ND
pins: 1, 2, 3, 4

## BT-12X12-2PIN
designator BT?
footprint BUTTON-12X12-2PIN
pins: 1 14, 2 15

## BT-12X12-LED
designator BT?
footprint BUTTON-12x12-LED
pins: 1 11, 2 13, 3 14, 4 12, 5, 6

## BUTTON 3.35x3.35x1.5
designator BT?, comment BUTTON
3.35mm 1.5mm 50mA Round Button Brick nogging 3.35mm 180gf 12V SMD Tactile Switches ROHS; Manufacturer: BZCN; Mfr.Part #: TSA007A1518B03; Name: BUTTON 3.35x3.35x1.5; So_Chan_Dan: 4; So_Chan_Cam: 0; Package: SMD
footprint BUTTON-3X3X1.5-4PIN
pins: 1, 2, 3, 4

## BUTTON 12x12x4.3
designator BT?, comment BUTTON
12mm 4.3mm 50mA Round Button Standing paste 12mm SPST 100MΩ 250gf 12V SMD,12x12mm Tactile Switches ROHS; Manufacturer: Hanbo Electronic; Mfr.Part #: TS-1103S; Name: BUTTON 12x12x4.3; So_Chan_Dan: 0; So_Chan_Cam: 4; Package: SMD,12x12mm
footprint SMD,12x12mm
pins: 1 11, 2 12, 3 14, 4 13

## BX-TS-26-3425TP
designator BT?, comment BUTTON
Tactile Switch SPST 260gf 2.5mm Gull Wing 3mm x 4mm Surface Mount; Manufacturer: Bossie; Mfr.Part #: BX-TS-26-3425TP; Package: SMD,3x4mm; LCSC Part #: C18078118; DigiKey Part Number: NO; ComponentLink1Description: Link; ComponentLink1URL: https://www.lcsc.com/product-detail/C18078118.html?s_z=n_c18078118; ComponentLink2Description: Link 1
footprint SMD,3x4mm
pins: 1, 2

## DP-08RP
designator SW?, comment 8BIT
SWITCH PIANO KEY DIP SPST 25mA 24V; Manufacturer: Korean Hroparts Elec; Mfr.Part #: DP-08RP; Package: Through Hole,P=2.54mm; LCSC Part #: C458097
footprint Through Hole,P=2.54mm,8BIT
pins: 1, 2, 3, 4, 5, 6, 7, 8, 9, 10, 11, 12, 13, 14, 15, 16
text: ON

## DSWB03LHGET
designator SW?, comment 3BIT
3 SPST Red Slide, Rocked Through Hole DIP Switches ROHS; Manufacturer: YE; Mfr.Part #: DSWB03LHGET; Package: Through Hole; LCSC Part #: C99420
footprint DIP SWITCH 3BIT
pins: 1, 2, 3, 4, 5, 6
text: ON

## FIDUCICAL MARK
designator Mark?
Fiducial mark
footprint Fiducial mark

## HY8M49SSMDOB2R20
designator X?, comment 8MHz
Crystal 8MHz ±20ppm 20pF 60Ω HC-49S-SMD; Manufacturer: Huiyuan crystal; Mfr.Part #: HY8M49SSMDOB2R20; Package: HC-49S-SMD; LCSC Part #: C5265773; DigiKey Part Number: NO
footprint HC-49S-SMD
pins: 1, 2
text: 8Mhz

## ICS-43434
designator MIC?
Multi-Mode Microphone with I²S Digital Output; Manufacturer: TDK InvenSense; Mfr.Part #: ICS-43434; LCSC Part #: C5656610; Package: LGA-6(3.5x2.7)
footprint ICS-43434
pins: 1 WS, 2 LR, 3 GND, 4 SCK, 5 VDD, 6 SD

## JOYSTICK-PS4
designator JS?
footprint JOYTICK-PS4
footprint JOYTICK-PS4
pins: 1 VCC1, 2 OUT1, 3 GND, 4 VCC2, 5 OUT2, 6 GND, 7 BT1, 8 BT2, 9 BT3, 10 BT4

## K2-1102AQ-H4CW-01
designator BT?, comment BUTTON
Tactile Switch 250gf 7.5mm 6mm x 6mm Through Hole, Right Angle; Manufacturer: Korean Hroparts Elec; Mfr.Part #: K2-1102AQ-H4CW-01; Package: Through Hole,Right Angle,6x6mm; LCSC Part #: C961738; DigiKey Part Number: NO; ComponentLink1Description: Link; ComponentLink1URL: https://www.lcsc.com/product-detail/C961738.html?s_z=n_K2-1102AQ-H4CW-01; ComponentLink2Description: Link 1
footprint K2-1102AQ-H4CW-01
pins: 1, 2

## K2-1103DP-X4SW-01
designator BT?, comment BUTTON
SWITCH TACTILE SPST 250gf TH; Manufacturer: Korean Hroparts Elec; Mfr.Part #: K2-1103DP-X4SW-01; Package: Through Hole-4P,12x12mm; LCSC Part #: C2888573
footprint BUTTON-12x12x17mm
pins: 1, 2, 3, 4

## LED 0603 GREEN YONGYUTAI
designator LED?, comment BLUE
Emerald 2.7V~3.2V 25mA -40℃~+85℃ 510nm~531nm 0603 LED Indication - Discrete ROHS; Manufacturer: YONGYUTAI; Mfr.Part #: YLED0603G; Name: LED 0603 GREEN YONGYUTAI; So_Chan_Dan: 2; So_Chan_Cam: 0; Package: 0603
footprint LED-0603
pins: 1 A, 2 K

## LED 1206 BLUE YONGYUTAI
designator LED?, comment BLUE
1206 LED Indication - Discrete ROHS; Manufacturer: YONGYUTAI; Mfr.Part #: YLED1206B; So_Chan_Cam: 0; So_Chan_Dan: 2; Name: LED 1206 BLUE YONGYUTAI; Package: 1206
footprint LED-BLUE-1206
pins: 1 A, 2 K